# Altium integrated library MS-Electronic.IntLib: 363 symbols (part 1 of 2) (continued)
## IC_LV14540DDAR
designator U?, comment LV14540DDAR
Buck Switching Regulator IC Positive Adjustable 0.8V 1 Output 5A 8-PowerSOIC (0.154", 3.90mm Width); Sort: IC Reg Buck; ComponentLink1Description: Aliexpress; ComponentLink1URL: https://vi.aliexpress.com/item/1005008065358411.html?spm=a2g0o.productlist.main.1.7e89Dx16Dx16m5&algo_pvid=ad094eb1-607a-4bec-86f1-b8c480b560e9&algo_exp_id=ad094eb1-607a-4bec-86f1-b8c480b560e9-0&pdp_ext_f=%7B%22order%22%3A%22-1%22%2C%22eval%22%3A%221%22%7D&pdp_npi=4%40dis%21VND%2162327%2162327%21%21%2117.30%2117.30%21%402140f53817468421014663818eb33d%2112000043513459686%21sea%21VN%214100105060%21X&curPageLogUid=bj85XK5ikHDZ&utparam-url=scene%3Asearch%7Cquery_from%3A; ComponentLink2Description: MOUSER; ComponentLink2URL: https://www.mouser.vn/ProductDetail/Texas-Instruments/LV14540DDAR?qs=GBLSl2Akiru4zvJrnTzNww%3D%3D; Package: 8-PowerSOIC
footprint IC_LV14540DDAR_SOIC
pins: 1 BOOT, 2 VIN, 3 EN, 4 RT/SYNC, 5 FB, 6 SS, 7 GND, 8 SW, 9 EXP

## IC_MAX485
designator U?, comment MAX485  (value not drawn)
Part Number: MAX485ESA+T; Description SEL: IC TRANSCEIVER HALF 1/1 8SOIC; Sort: TRANSCEIVER; ComponentLink1Description: LKD; ComponentLink1URL: https://banlinhkiendientu.vn/max485-max485csa/; Package: 8-SOIC
footprint SOIC8_NOTHERMAL
pins: 1 RO, 2 RE, 3 DE, 4 DI, 5 GND, 6 A, 7 B, 8 VCC

## IC_MPU9250
designator U?, comment MPU9250
Accelerometer, Gyroscope, Magnetometer, 9 Axis Sensor I2C, SPI Output; Sort: IMU; ComponentLink1Description: CXT; ComponentLink1URL: https://linhkien.cxtvn.com/6790-mpu-9250-imu-accelgyromag-i2cspi-24qfn.html; Package: 24-QFN
footprint IC_MPU9250
pins: 1 RESV, 2 NC, 3 NC, 4 NC, 5 NC, 6 NC, 7 AUX_CL, 8 VDDIO, 9 AD0/SDO, 10 REGOUT, 11 FSYNC, 12 INT, 13 VDD, 14 NC, 15 NC, 16 NC, 17 NC, 18 GND, 19 RESV, 20 RESV, 21 AUX_DA, 22 nCS, 23 SCL/SCLK, 24 SDA/SDI, 25 Exposed Pad

## IC_NCS20061SN2T1G
designator U?, comment NCS20061SN2T1G  Part Number: NCS20071SN2T1G
IC OPAMP GP 1 CIRCUIT 5TSOP; Manufacturer: onsemi; Current - Output / Channel: 25 mA; Voltage - Supply Span (Min): 3 V; Voltage - Supply Span (Max): 5.5 V; Footprint/Package: SOT-23-5; Sort: IC OPAMP; ComponentLink1Description: DIGIKEY; ComponentLink1URL: https://www.digikey.com/en/products/detail/onsemi/NCS20166SN2T1G/12180026
footprint IC_NCS20166SN2T1G
pins: 1 OUT, 2 V-, 3 IN+, 4 IN-, 5 V+
text: _; +

## IC_nRF24L01+
designator U?, comment nRF24L01+
Single Chip 2.4GHz Transceiver; Sort: RF; Package: QFN20 4X4
footprint IC_ nRF24L01+
pins: 1 CE, 2 CSN, 3 SCK, 4 MOSI, 5 MISO, 6 IRQ, 7 VDD, 8 VSS, 9 XC2, 10 XC1, 11 VDD_PA, 12 ANT1, 13 ANT2, 14 VSS, 15 VDD, 16 IREF, 17 VSS, 18 VDD, 19 DVDD, 20 VSS

## IC_ROE-0512S
designator U?, comment ROE-0512S
Isolated Module DC DC Converter 1 Output 12V 84mA 4.5V - 5.5V Input; Power: 1W; Description SEL: DC DC CONVERTER 12V 1W; Part Number: ROE-0512S; Input: 4.5V-5.5V; Output: 12V; Current: 84mA; ComponentLink1Description: DIGIKEY; ComponentLink1URL: https://www.digikey.com/en/products/detail/recom-power/ROE-0512S/5684098
footprint IC_ROE-0512S
pins: 1 GND (power), 2 VIN, 3 0V, 4 +VO

## IC_SN74LVC2G17DBVR
designator U?, comment SN74LVC2G17DBVR
IC BUF NON-INVERT 5.5V SC70-6; Mfr_Name: Texas Instruments; Mouting type: SMD; Sort: BUFF NON-INVERT; Manufacturer_Part_Number: SN74LVC2G17DBVR; MSL: 1; ComponentLink1Description: DIGIKEY; ComponentLink1URL: https://www.digikey.bg/en/products/detail/texas-instruments/SN74LVC2G17DBVR/479735; Package: SOT-23-6
footprint IC_SN74LVC2G17DBVR
pins: 1 1A, 2 GND, 3 2A, 4 2Y, 5 VCC, 6 1Y

## IC_SN74LVC3G17DCUR
designator U?, comment SN74LVC3G17DCUR
Buffer, Non-Inverting 3 Element 1 Bit per Element Push-Pull Output 8-VSSOP; Mfr_Name: Texas Instruments; Mouting type: SMD; Sort: BUFF NON-INVERT; Manufacturer_Part_Number: SN74LVC3G17DCUR; MSL: 1; ComponentLink1Description: CXT; ComponentLink1URL: https://linhkien.cxtvn.com/10332-sn74lvc3g17dcur-ic-buffer-non-invert-55v-8vssop.html; ComponentLink2Description: DIGIKEY; ComponentLink2URL: https://www.digikey.com/en/products/detail/texas-instruments/SN74LVC3G17DCUR/863652; Package: 8-VSSOP
footprint IC_SN74LVC3G17DCUR
pins: 1 1A, 2 3Y, 3 2A, 4 GND, 5 2Y, 6 3A, 7 1Y, 8 VCC

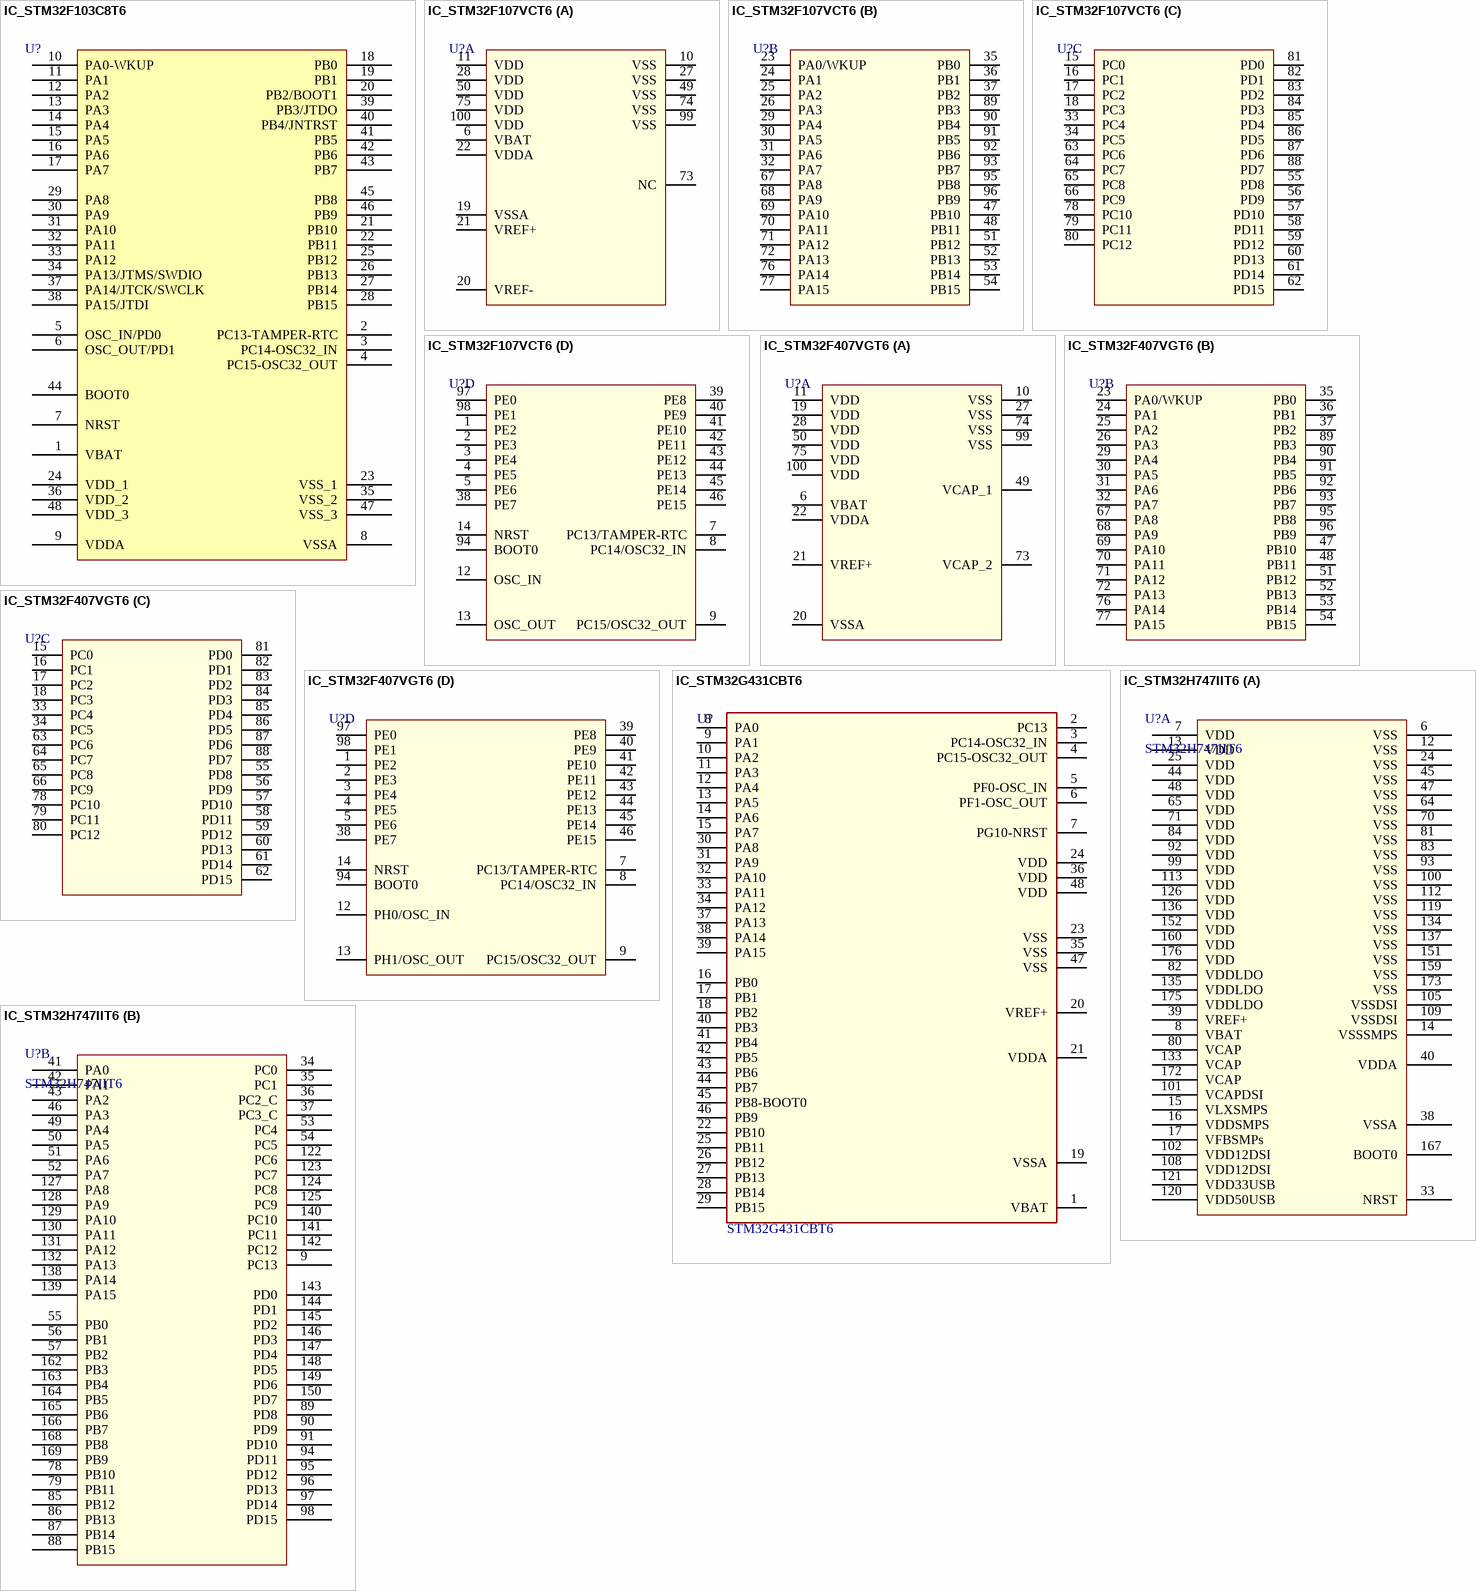
[diagram p5: symbols IC_STM32F103C8T6 to IC_STM32H747IIT6]

## IC_STM32F103C8T6
designator U?, comment STM32F103C8T6  (value not drawn)
STM32 ARM-based 32-bit MCU with 64 Kbytes Flash, 48-pin LQFP, Industrial Temperature; PackageReference: LQFP48; ComponentLink3Description: CXT; ComponentLink3URL: https://linhkien.cxtvn.com/1130-stm32f103c8t6-ic-mcu-32-bit-64kb-flash-48lqfp.html; Sort: MCU
footprint IC_STM32F103C8T6
pins: 1 VBAT, 2 PC13-TAMPER-RTC, 3 PC14-OSC32_IN, 4 PC15-OSC32_OUT, 5 OSC_IN/PD0, 6 OSC_OUT/PD1, 7 NRST, 8 VSSA, 9 VDDA, 10 PA0-WKUP, 11 PA1, 12 PA2, 13 PA3, 14 PA4, 15 PA5, 16 PA6, 17 PA7, 18 PB0, 19 PB1, 20 PB2/BOOT1, 21 PB10, 22 PB11, 23 VSS_1, 24 VDD_1, 25 PB12, 26 PB13, 27 PB14, 28 PB15, 29 PA8, 30 PA9, 31 PA10, 32 PA11, 33 PA12, 34 PA13/JTMS/SWDIO, 35 VSS_2, 36 VDD_2, 37 PA14/JTCK/SWCLK, 38 PA15/JTDI, 39 PB3/JTDO, 40 PB4/JNTRST, 41 PB5, 42 PB6, 43 PB7, 44 BOOT0, 45 PB8, 46 PB9, 47 VSS_3, 48 VDD_3

## IC_STM32F107VCT6
designator U?, comment STM32F107VCT6  (value not drawn)
Sort: MCU; ComponentLink1Description: CXT; ComponentLink1URL: https://linhkien.cxtvn.com/1565-stm32f107vct6-ic-mcu-32-bit-256kb-flash-lqfp100.html; ComponentLink2Description: MOUSER; ComponentLink2URL: https://www.mouser.vn/ProductDetail/STMicroelectronics/STM32F107VCT6?qs=1XJIe8X6XT1KmS9%252Be0Uqlg%3D%3D&srsltid=AfmBOook5THpVA88VouslcCXgHKMMoEBzzSPGBngcTiByRy0ecgl8l23; Package: 100LQFP
footprint IC_STM32F107VCT6
part A pins: 6 VBAT, 10 VSS, 11 VDD, 19 VSSA, 20 VREF-, 21 VREF+, 22 VDDA, 27 VSS, 28 VDD, 49 VSS, 50 VDD, 73 NC, 74 VSS, 75 VDD, 99 VSS, 100 VDD
part B pins: 23 PA0/WKUP, 24 PA1, 25 PA2, 26 PA3, 29 PA4, 30 PA5, 31 PA6, 32 PA7, 35 PB0, 36 PB1, 37 PB2, 47 PB10, 48 PB11, 51 PB12, 52 PB13, 53 PB14, 54 PB15, 67 PA8, 68 PA9, 69 PA10, 70 PA11, 71 PA12, 72 PA13, 76 PA14, 77 PA15, 89 PB3, 90 PB4, 91 PB5, 92 PB6, 93 PB7, 95 PB8, 96 PB9
part C pins: 15 PC0, 16 PC1, 17 PC2, 18 PC3, 33 PC4, 34 PC5, 55 PD8, 56 PD9, 57 PD10, 58 PD11, 59 PD12, 60 PD13, 61 PD14, 62 PD15, 63 PC6, 64 PC7, 65 PC8, 66 PC9, 78 PC10, 79 PC11, 80 PC12, 81 PD0, 82 PD1, 83 PD2, 84 PD3, 85 PD4, 86 PD5, 87 PD6, 88 PD7
part D pins: 1 PE2, 2 PE3, 3 PE4, 4 PE5, 5 PE6, 7 PC13/TAMPER-RTC, 8 PC14/OSC32_IN, 9 PC15/OSC32_OUT, 12 OSC_IN, 13 OSC_OUT, 14 NRST, 38 PE7, 39 PE8, 40 PE9, 41 PE10, 42 PE11, 43 PE12, 44 PE13, 45 PE14, 46 PE15, 94 BOOT0, 97 PE0, 98 PE1

## IC_STM32F407VGT6
designator U?, comment STM32F407VGT6  (value not drawn)
Sort: MCU; ComponentLink1Description: CXT; ComponentLink1URL: https://linhkien.cxtvn.com/1555-stm32f407vgt6ic-mcu-32bit-1mb-flash-100lqfp.html; Package: 100LQFP
footprint IC_STM32F107VCT6
part A pins: 6 VBAT, 10 VSS, 11 VDD, 19 VDD, 20 VSSA, 21 VREF+, 22 VDDA, 27 VSS, 28 VDD, 49 VCAP_1, 50 VDD, 73 VCAP_2, 74 VSS, 75 VDD, 99 VSS, 100 VDD
part B pins: 23 PA0/WKUP, 24 PA1, 25 PA2, 26 PA3, 29 PA4, 30 PA5, 31 PA6, 32 PA7, 35 PB0, 36 PB1, 37 PB2, 47 PB10, 48 PB11, 51 PB12, 52 PB13, 53 PB14, 54 PB15, 67 PA8, 68 PA9, 69 PA10, 70 PA11, 71 PA12, 72 PA13, 76 PA14, 77 PA15, 89 PB3, 90 PB4, 91 PB5, 92 PB6, 93 PB7, 95 PB8, 96 PB9
part C pins: 15 PC0, 16 PC1, 17 PC2, 18 PC3, 33 PC4, 34 PC5, 55 PD8, 56 PD9, 57 PD10, 58 PD11, 59 PD12, 60 PD13, 61 PD14, 62 PD15, 63 PC6, 64 PC7, 65 PC8, 66 PC9, 78 PC10, 79 PC11, 80 PC12, 81 PD0, 82 PD1, 83 PD2, 84 PD3, 85 PD4, 86 PD5, 87 PD6, 88 PD7
part D pins: 1 PE2, 2 PE3, 3 PE4, 4 PE5, 5 PE6, 7 PC13/TAMPER-RTC, 8 PC14/OSC32_IN, 9 PC15/OSC32_OUT, 12 PH0/OSC_IN, 13 PH1/OSC_OUT, 14 NRST, 38 PE7, 39 PE8, 40 PE9, 41 PE10, 42 PE11, 43 PE12, 44 PE13, 45 PE14, 46 PE15, 94 BOOT0, 97 PE0, 98 PE1

## IC_STM32G431CBT6
designator U?, comment STM32G431CBT6
IC MCU 32BIT 128KB FLASH 48LQFP; Manufacturer: STMicroelectronics; Category: IC; Footprint type: SMD; Footprint/Package: 48-LQFP; ComponentLink1Description: DIGIKEY; ComponentLink1URL: https://www.digikey.bg/en/products/detail/stmicroelectronics/STM32G431CBT6/10231567; Part Number: STM32G431CBT6
footprint IC_STM32G431CBT6
pins: 1 VBAT, 2 PC13, 3 PC14-OSC32_IN, 4 PC15-OSC32_OUT, 5 PF0-OSC_IN, 6 PF1-OSC_OUT, 7 PG10-NRST, 8 PA0, 9 PA1, 10 PA2, 11 PA3, 12 PA4, 13 PA5, 14 PA6, 15 PA7, 16 PB0, 17 PB1, 18 PB2, 19 VSSA, 20 VREF+, 21 VDDA, 22 PB10, 23 VSS, 24 VDD, 25 PB11, 26 PB12, 27 PB13, 28 PB14, 29 PB15, 30 PA8, 31 PA9, 32 PA10, 33 PA11, 34 PA12, 35 VSS, 36 VDD, 37 PA13, 38 PA14, 39 PA15, 40 PB3, 41 PB4, 42 PB5, 43 PB6, 44 PB7, 45 PB8-BOOT0, 46 PB9, 47 VSS, 48 VDD

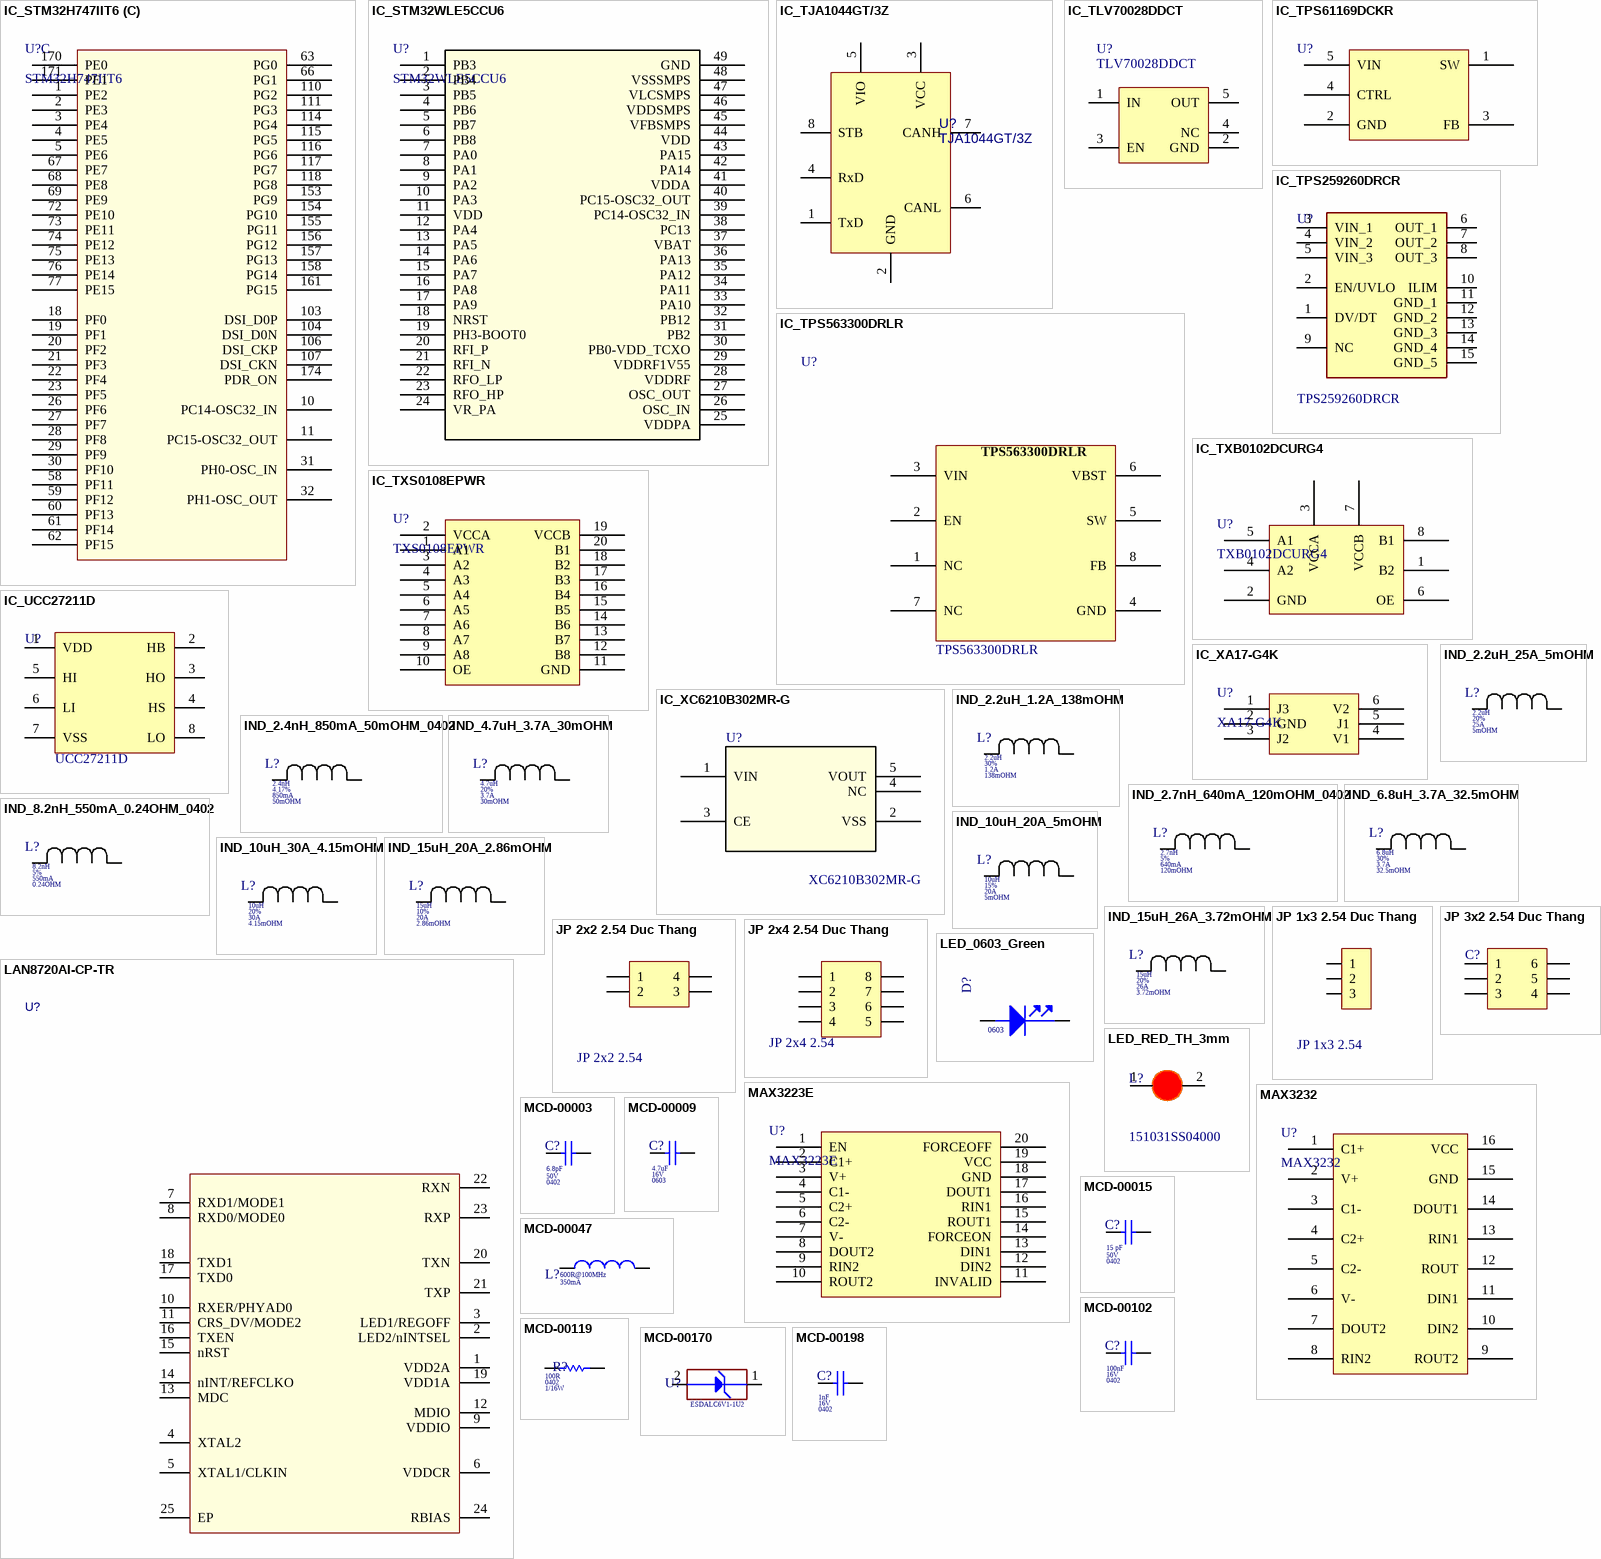
[diagram p6: symbols IC_STM32H747IIT6 to MCD-00198]

## IC_STM32H747IIT6
designator U?, comment STM32H747IIT6
IC MCU 32BIT 2MB FLASH 176LQFP; ComponentLink1Description: DIGIKEY; ComponentLink1URL: https://www.digikey.com/en/products/detail/stmicroelectronics/STM32H747IIT6/10326796?s=N4IgTCBcDaIMoBUCyBmMAJA7AFkwSTwQDYQBdAXyA; Package: 176-LQFP; Sort: MCU; Temperature: -40°C ~ 85°C; MSL: 3
footprint IC_STM32H747IIT6
part A pins: 6 VSS, 7 VDD, 8 VBAT, 12 VSS, 13 VDD, 14 VSSSMPS, 15 VLXSMPS, 16 VDDSMPS, 17 VFBSMPs, 24 VSS, 25 VDD, 33 NRST, 38 VSSA, 39 VREF+, 40 VDDA, 44 VDD, 45 VSS, 47 VSS, 48 VDD, 64 VSS, 65 VDD, 70 VSS, 71 VDD, 80 VCAP, 81 VSS, 82 VDDLDO, 83 VSS, 84 VDD, 92 VDD, 93 VSS, 99 VDD, 100 VSS, 101 VCAPDSI, 102 VDD12DSI, 105 VSSDSI, 108 VDD12DSI, 109 VSSDSI, 112 VSS, 113 VDD, 119 VSS, 120 VDD50USB, 121 VDD33USB, 126 VDD, 133 VCAP, 134 VSS, 135 VDDLDO, 136 VDD, 137 VSS, 151 VSS, 152 VDD, 159 VSS, 160 VDD, 167 BOOT0, 172 VCAP, 173 VSS, 175 VDDLDO, 176 VDD
part B pins: 9 PC13, 34 PC0, 35 PC1, 36 PC2_C, 37 PC3_C, 41 PA0, 42 PA1, 43 PA2, 46 PA3, 49 PA4, 50 PA5, 51 PA6, 52 PA7, 53 PC4, 54 PC5, 55 PB0, 56 PB1, 57 PB2, 78 PB10, 79 PB11, 85 PB12, 86 PB13, 87 PB14, 88 PB15, 89 PD8, 90 PD9, 91 PD10, 94 PD11, 95 PD12, 96 PD13, 97 PD14, 98 PD15, 122 PC6, 123 PC7, 124 PC8, 125 PC9, 127 PA8, 128 PA9, 129 PA10, 130 PA11, 131 PA12, 132 PA13, 138 PA14, 139 PA15, 140 PC10, 141 PC11, 142 PC12, 143 PD0, 144 PD1, 145 PD2, 146 PD3, 147 PD4, 148 PD5, 149 PD6, 150 PD7, 162 PB3, 163 PB4, 164 PB5, 165 PB6, 166 PB7, 168 PB8, 169 PB9
part C pins: 1 PE2, 2 PE3, 3 PE4, 4 PE5, 5 PE6, 10 PC14-OSC32_IN, 11 PC15-OSC32_OUT, 18 PF0, 19 PF1, 20 PF2, 21 PF3, 22 PF4, 23 PF5, 26 PF6, 27 PF7, 28 PF8, 29 PF9, 30 PF10, 31 PH0-OSC_IN, 32 PH1-OSC_OUT, 58 PF11, 59 PF12, 60 PF13, 61 PF14, 62 PF15, 63 PG0, 66 PG1, 67 PE7, 68 PE8, 69 PE9, 72 PE10, 73 PE11, 74 PE12, 75 PE13, 76 PE14, 77 PE15, 103 DSI_D0P, 104 DSI_D0N, 106 DSI_CKP, 107 DSI_CKN, 110 PG2, 111 PG3, 114 PG4, 115 PG5, 116 PG6, 117 PG7, 118 PG8, 153 PG9, 154 PG10, 155 PG11, 156 PG12, 157 PG13, 158 PG14, 161 PG15, 170 PE0, 171 PE1, 174 PDR_ON

## IC_STM32WLE5CCU6
designator U?, comment STM32WLE5CCU6
IC RF TXRX+MCU 802.15.4 48UFQFPN; Sort: MCU; ComponentLink1Description: Link; ComponentLink1URL: https://www.digikey.bg/en/products/detail/stmicroelectronics/STM32WLE5CCU6/13557445; Datasheet: https://www.mouser.vn/datasheet/2/389/stm32wle5c8-1903151.pdf; Package: 48UFQFPN
footprint IC_STM32WLE5CCU6
pins: 1 PB3, 2 PB4, 3 PB5, 4 PB6, 5 PB7, 6 PB8, 7 PA0, 8 PA1, 9 PA2, 10 PA3, 11 VDD, 12 PA4, 13 PA5, 14 PA6, 15 PA7, 16 PA8, 17 PA9, 18 NRST, 19 PH3-BOOT0, 20 RFI_P, 21 RFI_N, 22 RFO_LP, 23 RFO_HP, 24 VR_PA, 25 VDDPA, 26 OSC_IN, 27 OSC_OUT, 28 VDDRF, 29 VDDRF1V55, 30 PB0-VDD_TCXO, 31 PB2, 32 PB12, 33 PA10, 34 PA11, 35 PA12, 36 PA13, 37 VBAT, 38 PC13, 39 PC14-OSC32_IN, 40 PC15-OSC32_OUT, 41 VDDA, 42 PA14, 43 PA15, 44 VDD, 45 VFBSMPS, 46 VDDSMPS, 47 VLCSMPS, 48 VSSSMPS, 49 GND

## IC_TJA1044GT/3Z
designator U?, comment TJA1044GT/3Z
1/1 Transceiver Half CANbus 8-SO; Manufacturer: ON Semiconductor; Point: 8; Description SEL: IC TRANSCEIVER HALF 1/1 8SO; Part Number: TJA1044GT/3Z; ComponentLink1Description: DIGIKEY; ComponentLink1URL: https://www.digikey.bg/en/products/detail/nxp-usa-inc/TJA1044GT-3Z/7648357?s=N4IgTCBcDaICoCkCCBGADAFgwcTgegGYAtEAXQF8g; Sort: TRANSCEIVER; Package: 8-SOIC
footprint IC_TJA1044GT/3Z
pins: 1 TxD, 2 GND, 3 VCC, 4 RxD, 5 VIO, 6 CANL, 7 CANH, 8 STB

## IC_TLV70028DDCT
designator U?, comment TLV70028DDCT
Linear Voltage Regulator IC Positive Fixed 1 Output 200mA SOT-23-THIN; Manufacturer: Texas Instruments; Description SEL: IC REG LINEAR 2.8V 200MA SOT23-5; Voltage - Input (Max): 5.5V; Voltage - Output (Min/Fixed): 2.8V; Cross component: ME6211C28M5G-N; Sort: LDO; PartNumber: TLV70028DDCT; Current - Output: 200mA; Package: SOT-23-5; ComponentLink1Description: DIGIKEY; ComponentLink1URL: https://www.digikey.com/en/products/detail/texas-instruments/TLV70028DDCT/2176435
footprint IC_TLV70028DDCT
pins: 1 IN "Input supply voltage", 2 GND "Ground", 3 EN "Enable input", 4 NC "No connected", 5 OUT "Regulated output voltage"

## IC_TPS61169DCKR
designator U?, comment TPS61169DCKR  (value not drawn)
IC LED DRV RGLTR PWM 1.8A SC70-5; Sort: LED DRV; ComponentLink1Description: New link; ComponentLink1URL: https://www.digikey.bg/en/products/detail/texas-instruments/TPS61169DCKR/5048578?s=N4IgTCBcDaIC4AcDOA2AjGlBOAJgYwGsAnEAXQF8g; Package: SC70-5
footprint IC_TPS61169DCKR - duplicate
pins: 1 SW, 2 GND, 3 FB, 4 CTRL, 5 VIN

## IC_TPS259260DRCR
designator U?, comment TPS259260DRCR
IC ELECTRONIC FUSE 15% 10VSON; ComponentLink1Description: New link; ComponentLink1URL: https://www.digikey.bg/en/products/detail/texas-instruments/TPS259260DRCR/5481851?s=N4IgTCBcDaICoAUDKYCsBOMA2ADAEQCUBhAkAXQF8g; Sort: ELECTRONIC FUSE; Package: 10VSON
footprint IC_TPS259260DRCR
pins: 1 DV/DT, 2 EN/UVLO, 3 VIN_1, 4 VIN_2, 5 VIN_3, 6 OUT_1, 7 OUT_2, 8 OUT_3, 9 NC, 10 ILIM, 11 GND_1, 12 GND_2, 13 GND_3, 14 GND_4, 15 GND_5

## IC_TPS563300DRLR
designator U?, comment TPS563300DRLR
IC REG BUCK ADJ 3A SOT583; Manufacture 1: Texas Instruments; Mouting Type: SMD; Packing: Reel; MSL: 1; Package: SOT-583; Sort: IC REG BUCK; Temperature: -40°C ~ 150°C; ComponentLink1Description: New link; ComponentLink1URL: https://www.digikey.com/en/products/detail/texas-instruments/TPS563300DRLR/16669318?s=N4IgTCBcDaICoAUDKBWAbAZgwBmwEQCUAZAkAXQF8g; Type: REG BUCK; Manufacture Part Number 1: TPS563300DRLR
footprint IC_TPS563300DRLR
pins: 1 NC, 2 EN, 3 VIN, 4 GND, 5 SW, 6 VBST, 7 NC, 8 FB

## IC_TXB0102DCURG4
designator U?, comment TXB0102DCURG4
IC TRANSLTR BIDIRECTIONAL 8VSSOP; ComponentLink1Description: New link; ComponentLink1URL: https://linhkien.cxtvn.com/6065-txb0102dcur-ic-trnsltr-bidirectional-8-vssop.html; ComponentLink2Description: New link 1; ComponentLink2URL: https://www.digikey.com/en/products/detail/texas-instruments/TXB0102DCURG4/1910148; Sort: TRANSLTR BIDIRECTIONAL; Package: 8VSSOP
footprint IC_TXB0102DCURG4
pins: 1 B2, 2 GND, 3 VCCA, 4 A2, 5 A1, 6 OE, 7 VCCB, 8 B1

## IC_TXS0108EPWR
designator U?, comment TXS0108EPWR
IC TRANSLATOR BIDIR 20TSSOP; ComponentLink1Description: New link; ComponentLink1URL: https://linhkien.cxtvn.com/5101-txs0108epwr-ic-translator-bidirectional-60mbps-20-tssop.html; ComponentLink2Description: New link 1; ComponentLink2URL: https://www.digikey.com/en/products/detail/texas-instruments/TXS0108EPWR/1775302; Sort: TRANSLATOR BIDIR; Package: 20TSSOP
footprint IC_TXS0108EPWR
pins: 1 A1, 2 VCCA, 3 A2, 4 A3, 5 A4, 6 A5, 7 A6, 8 A7, 9 A8, 10 OE, 11 GND, 12 B8, 13 B7, 14 B6, 15 B5, 16 B4, 17 B3, 18 B2, 19 VCCB, 20 B1

## IC_UCC27211D
designator U?, comment UCC27211D
Half-Bridge Gate Driver IC Non-Inverting 8-SOIC; Manufacturer: Texas Instruments; Sort: IC GATE DRVR; Number of Drivers: 2; Gate Type: MOSFET (N-Channel); Voltage - Supply: 8V ~ 17V; Current - Peak Output (Source, Sink): 4A, 4A; High Side Voltage - Max (Bootstrap): 120 V; Footprint/Package: SOIC-8; Input Type: Non-Inverting; ComponentLink1Description: DIGIKEY; ComponentLink1URL: https://www.digikey.com/en/products/detail/texas-instruments/UCC27211D/2793757; Part Number: UCC27211D
footprint IC_UCC27211D
pins: 1 VDD, 2 HB, 3 HO, 4 HS, 5 HI, 6 LI, 7 VSS, 8 LO

## IC_XA17-G4K
designator U?, comment XA17-G4K
20MHz~4GHz 25dB 0.7dB SOT-363 RF Switches ROHS; ComponentLink1Description: LCSC; ComponentLink1URL: https://www.lcsc.com/product-detail/RF-Switches_XINLUDA-XA17-G4K_C513494.html; Sort: RF Switch; Package: SOT-363
footprint IC_XA17-G4K
pins: 1 J3, 2 GND, 3 J2, 4 V1, 5 J1, 6 V2

## IC_XC6210B302MR-G
designator U?, comment XC6210B302MR-G
Linear Voltage Regulator IC Positive Fixed 1 Output 700mA SOT-25-5; Manufacturer: Torex Semiconductor Ltd; Description SEL: IC REG LINEAR 3V 700MA SOT25; Voltage - Input (Max): 6V; Voltage - Output (Min/Fixed): 3V; Sort: LDO; PartNumber: XC6210B302MR-G; Current - Output: 700mA; Package: SOT-25-5; ComponentLink1Description: DIGIKEY; ComponentLink1URL: https://www.digikey.com/en/products/detail/torex-semiconductor-ltd/XC6210B302MR-G/2138118
footprint IC_XC6210B302MR-G
pins: 1 VIN (power), 2 VSS (power), 3 CE, 4 NC, 5 VOUT

## IND_2.2uH_1.2A_138mOHM
designator L?, comment DCR: 138mOHM  Current: 1.2A  Tolerance: 30%  Inductance: 2.2uH  (hidden comment: LQM2MPN2R2NG0L)
2.2 µH Shielded Multilayer Inductor 1.2 A 138mOhm Max 0806 (2016 Metric); ComponentLink1Description: DIGIKEY; ComponentLink1URL: https://www.digikey.com/en/products/detail/murata-electronics/LQM2MPN2R2NG0L/4358099?s=N4IgTCBcDaIDIEUCyYkAUByYBKYMHEAGEAXQF8g
footprint IND_LQM2MPN2R2NG0L
pins: 1, 2

## IND_2.2uH_25A_5mOHM
designator L?, comment DCR: 5mOHM  Current: 25A  Tolerance: 20%  Inductance: 2.2uH  (hidden comment: NRS8040T6R8NJGJ)
2.2 µH Shielded Wirewound Inductor 25 A 5mOhm Max Nonstandard; ComponentLink1Description: DIGIKEY; ComponentLink1URL: https://www.digikey.com/en/products/detail/bourns-inc/SRP1245CC-2R2M/21263788
footprint IND_SRP1245CC-2R2M
pins: 1, 2